# Altium footprint library WE Inductors.PcbLib: 131 footprints (part 5 of 9)
Each footprint in its own frame and in the unit in brackets; x right, y up, seen from the top. Pads: shape width x height; smd on the part's side, far side on the other; paste and mask are expansions set on the pad; w line width, h text height; cw(c..) or ccw(c..) is an arc to the next point about the centre after c.
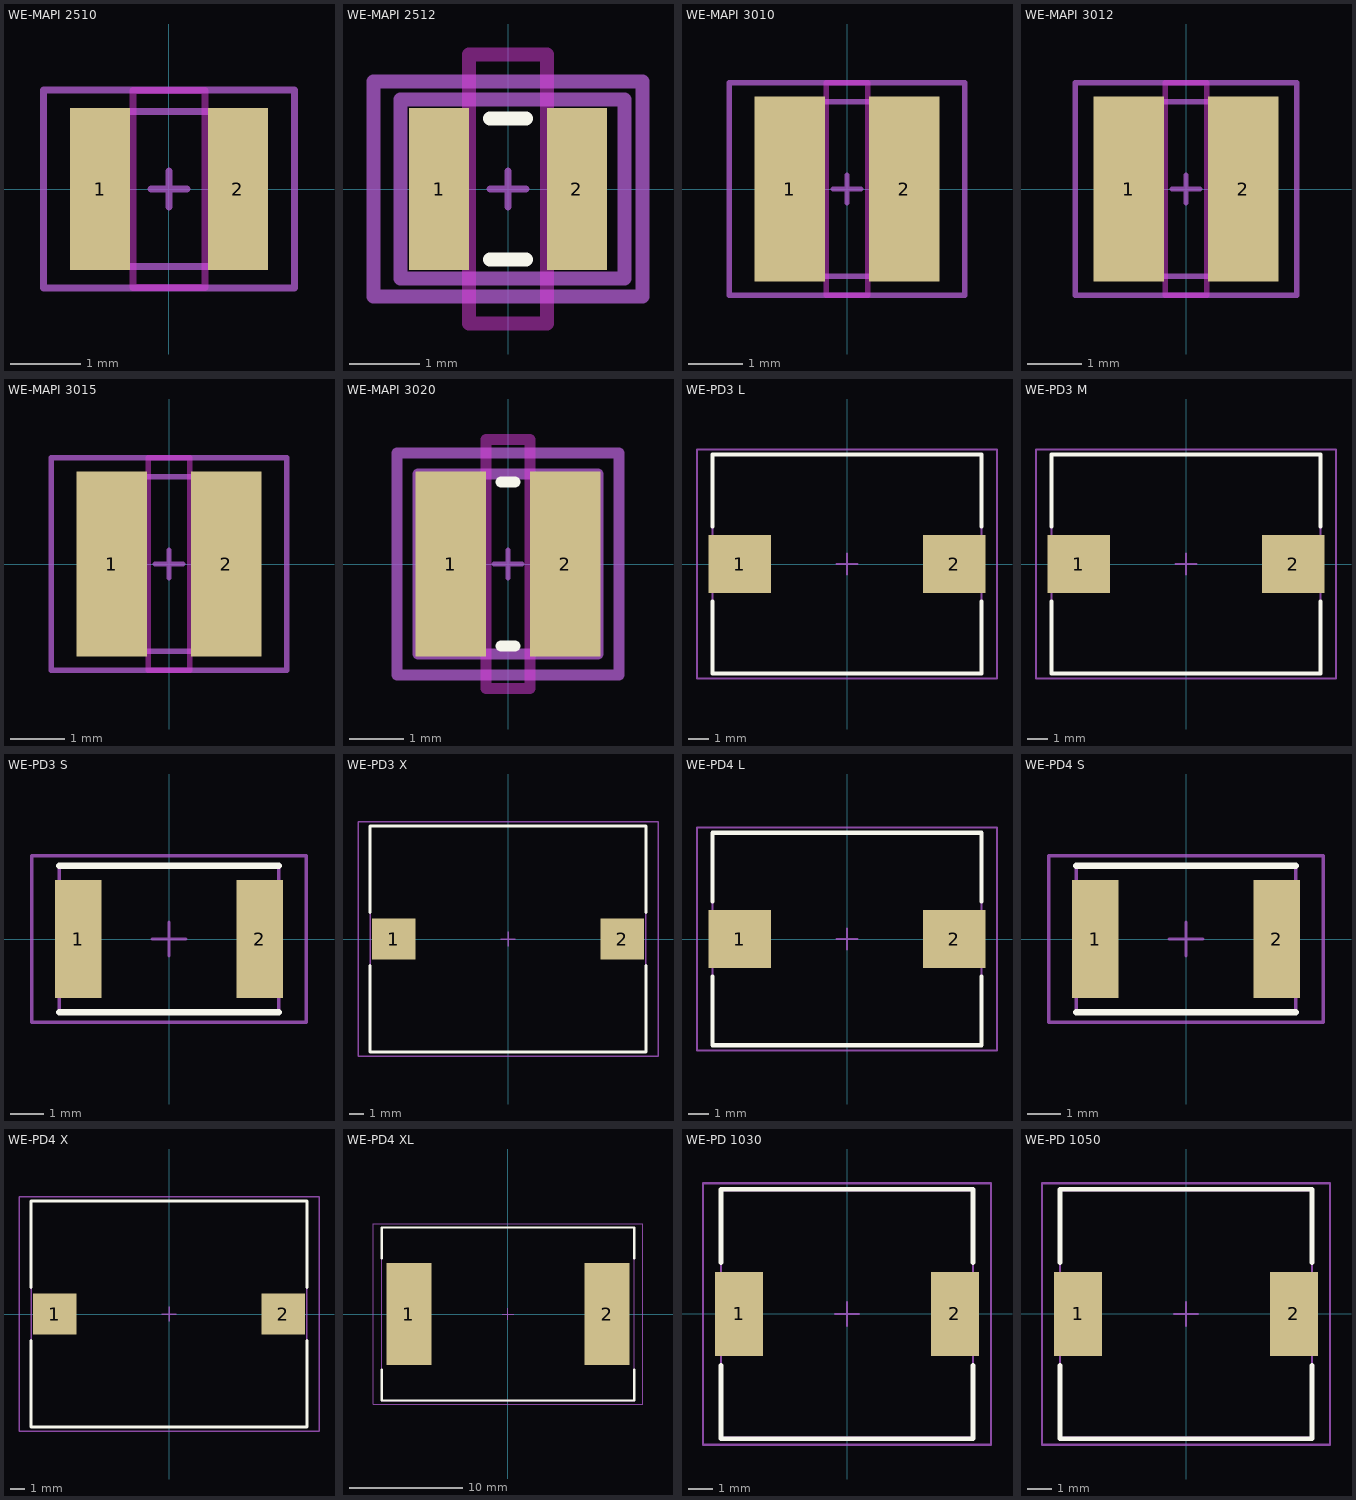
[diagram p4: the footprints below, top view; thin cyan lines are the x and y axes]

## WE-MAPI 2510 [mm] "Chip Inductor, 2-Leads, Body 2.5x2.0mm, IPC Medium Density"
height 1
pads (2):
  rect 0.85x2.3 smd: 1(-0.975,0) 2(0.975,0)
Keep-Out Layer:
  lines w0.1: -0.508,-1.397 -0.508,1.397 0.508,1.397 0.508,-1.397 -0.508,-1.397
Mechanical 13:
  lines w0.1: -1.35,-1.1 -1.35,1.1 1.35,1.1 1.35,-1.1 -1.35,-1.1
Mechanical 15:
  lines w0.1: -0.254,0 0.254,0 ; 0,-0.254 0,0.254 ; -1.778,-1.4 -1.778,1.4 1.778,1.4 1.778,-1.4 -1.778,-1.4
  text ".Designator" at 0,0 h0.76
3D body: height 1, standoff 0, extent -1.25,-1 1.25,1

## WE-MAPI 2512 [mm] "Chip Inductor, 2-Leads, Body 2.5x 2mm,IPC Medium Density"
height 1.2
pads (2):
  rect 0.85x2.3 smd: 1(-0.975,0) 2(0.975,0)
Top Overlay:
  lines w0.2: -0.254,-1 0.254,-1 ; -0.254,1 0.254,1
Keep-Out Layer:
  lines w0.2: -0.55,-1.905 -0.55,1.905 0.55,1.905 0.55,-1.905 -0.55,-1.905
Mechanical 13:
  lines w0.2: -1.524,-1.27 -1.524,1.27 1.651,1.27 1.651,-1.27 -1.524,-1.27
Mechanical 15:
  lines w0.1: -0.254,0 0.254,0 ; 0,-0.254 0,0.254
  lines w0.2: -1.905,-1.524 1.905,-1.524 1.905,1.524 -1.905,1.524 -1.905,-1.524
  text ".Designator" at 0,0 h0.76
3D body: height 1.2, standoff 0, extent -1.25,-1 1.25,1

## WE-MAPI 3010 [mm] "Chip Inductor, 2-Leads, Body 3.0x3.0mm, IPC Medium Density"
height 1
pads (2):
  rect 1.3x3.4 smd: 1(-1.05,0) 2(1.05,0)
Keep-Out Layer:
  lines w0.1: -0.381,-1.95 0.381,-1.95 0.381,1.95 -0.381,1.95 -0.381,-1.95
Mechanical 13:
  lines w0.1: -1.6,-1.6 1.6,-1.6 1.6,1.6 -1.6,1.6 -1.6,-1.6
Mechanical 15:
  lines w0.1: -0.254,0 0.254,0 ; 0,-0.254 0,0.254 ; -2.159,-1.95 2.159,-1.95 2.159,1.95 -2.159,1.95 -2.159,-1.95
  text ".Designator" at 0,0 h0.76
3D body: height 1, standoff 0, extent -1.5,-1.5 1.5,1.5

## WE-MAPI 3012 [mm] "Chip Inductor, 2-Leads, Body 3.0x3.0mm, IPC Medium Density"
height 1.2
pads (2):
  rect 1.3x3.4 smd: 1(-1.05,0) 2(1.05,0)
Keep-Out Layer:
  lines w0.1: -0.381,-1.95 -0.381,1.95 0.381,1.95 0.381,-1.95 -0.381,-1.95
Mechanical 13:
  lines w0.1: -1.6,-1.6 1.6,-1.6 1.6,1.6 -1.6,1.6 -1.6,-1.6
Mechanical 15:
  lines w0.1: -0.254,0 0.254,0 ; 0,-0.254 0,0.254 ; -2.032,-1.95 2.032,-1.95 2.032,1.95 -2.032,1.95 -2.032,-1.95
  text ".Designator" at 0,0 h0.76
3D body: height 1.2, standoff 0, extent -1.5,-1.5 1.5,1.5

## WE-MAPI 3015 [mm] "Chip Inductor, 2-Leads, Body 3.0x3.0mm, IPC Medium Density"
height 1.5
pads (2):
  rect 1.3x3.4 smd: 1(-1.05,0) 2(1.05,0)
Keep-Out Layer:
  lines w0.1: -0.381,-1.95 0.381,-1.95 0.381,1.95 -0.381,1.95 -0.381,-1.95
Mechanical 13:
  lines w0.1: -1.6,-1.6 -1.6,1.6 1.6,1.6 1.6,-1.6 -1.6,-1.6
Mechanical 15:
  lines w0.1: -0.254,0 0.254,0 ; 0,-0.254 0,0.254 ; -2.159,-1.95 -2.159,1.95 2.159,1.95 2.159,-1.95 -2.159,-1.95
  text ".Designator" at 0,0 h0.76
3D body: height 1.2, standoff 0, extent -1.5,-1.5 1.5,1.5

## WE-MAPI 3020 [mm] "Chip Inductor, 2-Leads, Body 3x 3mm,IPC Medium Density"
height 2
pads (2):
  rect 1.3x3.4 smd: 1(-1.05,0) 2(1.05,0)
Top Overlay:
  lines w0.2: -0.127,-1.5 0.127,-1.5 ; -0.127,1.5 0.127,1.5
Keep-Out Layer:
  lines w0.2: -0.4,-2.286 0.4,-2.286 0.4,2.286 -0.4,2.286 -0.4,-2.286
Mechanical 13:
  lines w0.2: -1.651,-1.651 1.651,-1.651 1.651,1.651 -1.651,1.651 -1.651,-1.651
Mechanical 15:
  lines w0.1: -0.254,0 0.254,0 ; 0,-0.254 0,0.254
  lines w0.2: -2.032,-2.032 -2.032,2.032 2.032,2.032 2.032,-2.032 -2.032,-2.032
  text ".Designator" at 0,0 h0.76
3D body: height 2, standoff 0, extent -1.5,-1.5 1.5,1.5

## WE-PD3 L [mm] "SMD Inductor, 2-Leads, Body 12,7x10,3mm"
height 4.9
pads (2):
  rect 3x2.8 smd: 1(-5.15,0) 2(5.15,0)
Top Overlay:
  lines w0.2: -6.45,-1.8 -6.45,-5.25 6.45,-5.25 6.45,-1.8 ; -6.45,1.8 -6.45,5.25 6.45,5.25 6.45,1.8
Mechanical 13:
  lines w0.1: -6.45,-5.25 6.45,-5.25 6.45,5.25 -6.45,5.25 -6.45,-5.25
Mechanical 15:
  lines w0.1: -0.5,0 0.5,0 ; 0,-0.5 0,0.5 ; -7.2,-5.5 7.2,-5.5 7.2,5.5 -7.2,5.5 -7.2,-5.5
3D body: height 4.89, standoff -0.01, extent -6.35,-5 6.35,5

## WE-PD3 M [mm] "SMD Inductor, 2-Leads, Body 12,7x10,3mm"
height 2.7
pads (2):
  rect 3x2.8 smd: 1(-5.15,0) 2(5.15,0)
Top Overlay:
  lines w0.2: -6.45,-1.8 -6.45,-5.25 6.45,-5.25 6.45,-1.8 ; -6.45,1.8 -6.45,5.25 6.45,5.25 6.45,1.8
Mechanical 13:
  lines w0.1: -6.45,-5.25 -6.45,5.25 6.45,5.25 6.45,-5.25 -6.45,-5.25
Mechanical 15:
  lines w0.1: -0.5,0 0.5,0 ; 0,-0.5 0,0.5 ; -7.2,-5.5 -7.2,5.5 7.2,5.5 7.2,-5.5 -7.2,-5.5
3D body: height 2.69, standoff -0.01, extent -6.35,-5 6.35,5

## WE-PD3 S [mm] "SMD Inductor, 2-Leads, Body 6,6x4,4mm"
height 2.92
pads (2):
  rect 1.4x3.56 smd: 1(-2.73,0) 2(2.73,0)
Top Overlay:
  lines w0.2: -3.3,-2.2 3.3,-2.2 ; -3.3,2.2 3.3,2.2
Mechanical 13:
  lines w0.1: -3.3,-2.225 -3.3,2.225 3.3,2.225 3.3,-2.225 -3.3,-2.225
Mechanical 15:
  lines w0.1: -0.5,0 0.5,0 ; 0,-0.5 0,0.5 ; -4.125,-2.5 -4.125,2.5 4.125,2.5 4.125,-2.5 -4.125,-2.5
3D body: height 2.91, standoff -0.01, extent -3.3,-2.225 3.3,2.225

## WE-PD3 X [mm] "SMD Inductor, 2-Leads, Body 18,5x15,2mm"
height 7.62
pads (2):
  rect 2.92x2.79 smd: 1(-7.685,0) 2(7.685,0)
Top Overlay:
  lines w0.2: -9.3,-1.795 -9.3,-7.6 9.3,-7.6 9.3,-1.795 ; -9.3,1.795 -9.3,7.6 9.3,7.6 9.3,1.795
Mechanical 13:
  lines w0.1: -9.27,-7.62 9.27,-7.62 9.27,7.62 -9.27,7.62 -9.27,-7.62
Mechanical 15:
  lines w0.1: -0.5,0 0.5,0 ; 0,-0.5 0,0.5 ; -10.1,-7.9 10.1,-7.9 10.1,7.9 -10.1,7.9 -10.1,-7.9
3D body: height 7.61, standoff -0.01, extent -9.27,-7.64 9.27,7.6

## WE-PD4 L [mm] "SMD Inductor, 2-Leads, Body 12,7x10,0mm"
height 5.3
pads (2):
  rect 3x2.8 smd: 1(-5.15,0) 2(5.15,0)
Top Overlay:
  lines w0.2: -6.45,-1.8 -6.45,-5.1 6.45,-5.1 6.45,-1.8 ; -6.45,1.8 -6.45,5.1 6.45,5.1 6.45,1.8
Mechanical 13:
  lines w0.1: -6.45,-5.1 -6.45,5.1 6.45,5.1 6.45,-5.1 -6.45,-5.1
Mechanical 15:
  lines w0.1: -0.5,0 0.5,0 ; 0,-0.5 0,0.5 ; -7.2,-5.35 -7.2,5.35 7.2,5.35 7.2,-5.35 -7.2,-5.35
3D body: height 4.99, standoff -0.01, extent -6.35,-4.95 6.35,4.968

## WE-PD4 S [mm] "SMD Inductor, 2-Leads, Body 6,6x4,4mm,"
height 2.92
pads (2):
  rect 1.4x3.56 smd: 1(-2.73,0) 2(2.73,0)
Top Overlay:
  lines w0.2: -3.3,-2.2 3.3,-2.2 ; -3.3,2.2 3.3,2.2
Mechanical 13:
  lines w0.1: -3.3,-2.225 -3.3,2.225 3.3,2.225 3.3,-2.225 -3.3,-2.225
Mechanical 15:
  lines w0.1: -0.5,0 0.5,0 ; 0,-0.5 0,0.5 ; -4.125,-2.5 -4.125,2.5 4.125,2.5 4.125,-2.5 -4.125,-2.5
3D body: height 2.91, standoff -0.01, extent -3.3,-2.225 3.3,2.225

## WE-PD4 X [mm] "SMD Inductor, 2-Leads, Body 18,5x15,2mm"
height 7.11
pads (2):
  rect 2.92x2.79 smd: 1(-7.685,0) 2(7.685,0)
Top Overlay:
  lines w0.2: -9.3,-1.795 -9.3,-7.6 9.3,-7.6 9.3,-1.795 ; -9.3,1.795 -9.3,7.6 9.3,7.6 9.3,1.795
Mechanical 13:
  lines w0.1: -9.27,-7.62 -9.27,7.62 9.27,7.62 9.27,-7.62 -9.27,-7.62
Mechanical 15:
  lines w0.1: -0.5,0 0.5,0 ; 0,-0.5 0,0.5 ; -10.1,-7.9 -10.1,7.9 10.1,7.9 10.1,-7.9 -10.1,-7.9
3D body: height 7.1, standoff -0.01, extent -9.27,-7.52 9.27,7.55

## WE-PD4 XL [mm] "SMD Inductor, 2-Leads, Body 22,0x15,0mm"
height 7.8
pads (2):
  rect 4x9 smd: 1(-8.75,0) 2(8.75,0)
Top Overlay:
  lines w0.2: -11.15,-4.9 -11.15,-7.65 11.15,-7.65 11.15,-4.9 ; -11.15,4.9 -11.15,7.65 11.15,7.65 11.15,4.9
Mechanical 13:
  lines w0.1: -11.15,-7.65 11.15,-7.65 11.15,7.65 -11.15,7.65 -11.15,-7.65
Mechanical 15:
  lines w0.1: -0.5,0 0.5,0 ; 0,-0.5 0,0.5 ; -11.9,-7.95 11.9,-7.95 11.9,7.95 -11.9,7.95 -11.9,-7.95
3D body: height 6.99, standoff -0.01, extent -11,-7.5 11,7.5

## WE-PD 1030 [mm] "SMD Inductor, 2-Leads, Body 10,0x10,0mm"
height 3
pads (2):
  rect 2x3.5 smd: 1(-4.5,0) 2(4.5,0)
Top Overlay:
  lines w0.2: -5.25,-2.15 -5.25,-5.2 5.25,-5.2 5.25,-2.15 ; -5.25,2.15 -5.25,5.2 5.25,5.2 5.25,2.15
Mechanical 13:
  lines w0.1: -5.25,-5.15 5.25,-5.15 5.25,5.15 -5.25,5.15 -5.25,-5.15
Mechanical 15:
  lines w0.1: -0.5,0 0.5,0 ; 0,-0.5 0,0.5 ; -6,-5.45 6,-5.45 6,5.45 -6,5.45 -6,-5.45
3D body: height 2.7, standoff -0.05, extent -5,-5 5,5

## WE-PD 1050 [mm] "SMD Inductor, 2-Leads, Body 10,0x10,0mm"
height 5
pads (2):
  rect 2x3.5 smd: 1(-4.5,0) 2(4.5,0)
Top Overlay:
  lines w0.2: -5.25,-2.15 -5.25,-5.2 5.25,-5.2 5.25,-2.15 ; -5.25,2.15 -5.25,5.2 5.25,5.2 5.25,2.15
Mechanical 13:
  lines w0.1: -5.25,-5.15 -5.25,5.15 5.25,5.15 5.25,-5.15 -5.25,-5.15
Mechanical 15:
  lines w0.1: -0.5,0 0.5,0 ; 0,-0.5 0,0.5 ; -6,-5.45 -6,5.45 6,5.45 6,-5.45 -6,-5.45
3D body: height 4.75, standoff -0.05, extent -5,-5 5,5